# Altium footprint library 元件库PCB.PcbLib: 63 footprints (part 4 of 4)
Each footprint in its own frame and in the unit in brackets; x right, y up, seen from the top. Pads: shape width x height; smd on the part's side, far side on the other; paste and mask are expansions set on the pad; w line width, h text height; cw(c..) or ccw(c..) is an arc to the next point about the centre after c.
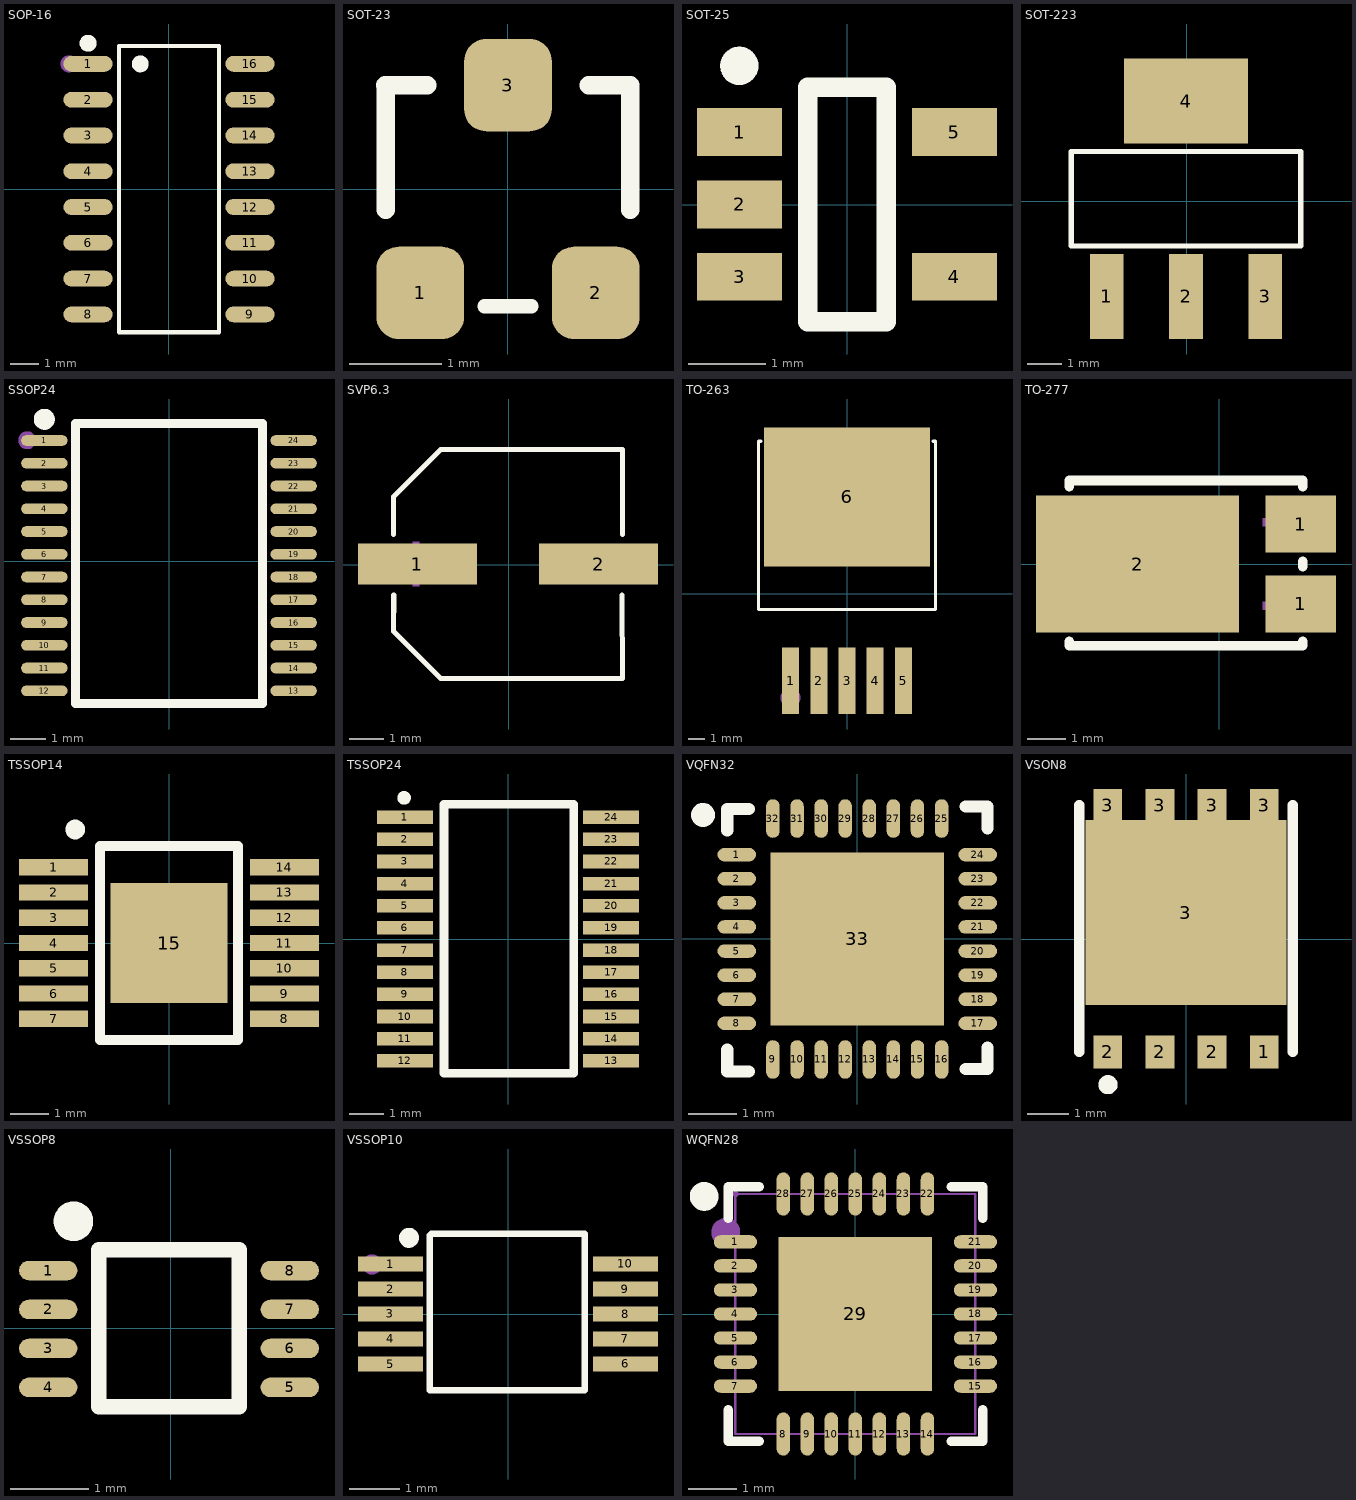
[diagram p3: the footprints below, top view; thin cyan lines are the x and y axes]

## SOP-16 [mm]
pads (16):
  oval 1.745x0.56 smd mask+0.051: 1(-2.872,4.445) 2(-2.872,3.175) 3(-2.872,1.905) 4(-2.872,0.635) 5(-2.872,-0.635) 6(-2.872,-1.905) 7(-2.872,-3.175) 8(-2.872,-4.445) 9(2.872,-4.445) 10(2.872,-3.175) 11(2.872,-1.905) 12(2.872,-0.635) 13(2.872,0.635) 14(2.872,1.905) 15(2.872,3.175) 16(2.872,4.445)
Top Overlay:
  circle w0.3: c-2.872,5.177 r0.15
  circle w0.3: c-1.019,4.445 r0.15
  lines w0.152: -1.771,-5.076 -1.771,5.076 1.771,5.076 1.771,-5.076 -1.771,-5.076
Mechanical 6:
  circle w0.3: c-3.55,4.445 r0.15
3D body "User Library-sop16-1.step": height 1.58, standoff 0, extent -3.117,-4.991 3.117,4.99

## SOT-23 [mm]
height 1.1
pads (3):
  rrect50% 0.95x1 smd: 1(-0.95,-1.125) 2(0.95,-1.125) 3(0,1.125)
Top Overlay:
  lines w0.152: -0.254,-1.27 0.254,-1.27
  lines w0.2: -1.328,1.125 -0.875,1.125 ; -1.325,-0.225 -1.325,1.125 ; 0.875,1.125 1.325,1.125 1.325,-0.225
3D body "User Library-SOT23-3.step": height 1.3, standoff 0, extent -1.448,-1.397 1.452,1.403

## SOT-25 [mil]
pads (5):
  rect 43.5x24.5 smd: 1(-55,37.01) 2(-55,0.01) 3(-55,-36.99) 4(55,-36.99) 5(55,37.01)
Top Overlay:
  lines w9.8: -60,70.91 ccw(c-55.1,70.96) -60,71.01
  lines w10: -20,-60 20,-60 20,60 -20,60 -20,-60
3D body "User Library-sot25.step": height 43.31, standoff -1.97, extent -47.24,-58.11 47.24,60

## SOT-223 [mm]
pads (4):
  rect 0.98x2.47 smd: 1(-2.327,-2.757) 2(-0.027,-2.757) 3(2.273,-2.757)
  rect 3.6x2.47 smd: 4(-0.027,2.913)
Top Overlay:
  lines w0.152: -3.353,-1.293 -3.353,1.45 3.3,1.45 3.3,-1.293 -3.353,-1.293
3D body "ALSRobot-SOT223.step": height 1.65, standoff 0, extent -3.25,-3.5 3.25,3.5

## SSOP24 [mm]
pads (24):
  oval 1.324x0.308 smd: 1(-3.562,3.448) 2(-3.562,2.798) 3(-3.562,2.148) 4(-3.562,1.498) 5(-3.562,0.848) 6(-3.562,0.198) 7(-3.562,-0.452) 8(-3.562,-1.102) 9(-3.562,-1.752) 10(-3.562,-2.402) 11(-3.562,-3.052) 12(-3.562,-3.702) 13(3.562,-3.702) 14(3.562,-3.052) 15(3.562,-2.402) 16(3.562,-1.752) 17(3.562,-1.102) 18(3.562,-0.452) 19(3.562,0.198) 20(3.562,0.848) 21(3.562,1.498) 22(3.562,2.148) 23(3.562,2.798) 24(3.562,3.448)
Top Overlay:
  circle w0.3: c-3.562,4.054 r0.15
  lines w0.254: -2.667,-4.064 -2.667,3.937 2.667,3.937 2.667,-4.064 -2.667,-4.064
Mechanical 15:
  circle w0.254: c-4.046,3.455 r0.127
3D body "User Library-SSOP 24 PIN_.step": height 1.98, standoff 0, extent -3.95,-4.442 3.95,4.188

## SVP6.3 [mm]
pads (2):
  rect 3.5x1.2 smd: 1(-2.695,0.023) 2(2.645,0.023)
Top Overlay:
  lines w0.152: -3.401,0.889 -3.401,2.003 -2.005,3.399 3.351,3.399 3.345,0.889 ; -3.39,-0.889 -3.401,-1.958 -2.006,-3.353 3.351,-3.353 3.332,-0.889
Mechanical 15:
  region: 3.077,0.122 3.077,-0.076 2.285,-0.076 2.285,0.122
  region: -3.127,0.122 -3.127,-0.076 -2.335,-0.076 -2.335,0.122
  region: -2.835,0.683 -2.835,-0.637 -2.637,-0.637 -2.637,0.683
3D body "User Library-CAP SMD SVP 6_3x5_9.STEP": height 5.9, standoff 0, extent -3.65,-3.3 3.65,3.3

## TO-263 [mm]
pads (6):
  rect 1.02x4 smd: 1(-3.427,-5.267) 2(-1.727,-5.267) 3(-0.027,-5.267) 4(1.673,-5.267) 5(3.373,-5.267)
  rect 10x8.4 smd: 6(-0.027,5.833)
Top Overlay:
  lines w0.2: -5.231,9.193 -5.361,9.193 -5.361,-0.967 5.307,-0.967 5.307,9.193 5.177,9.193 ; -3.846,-0.967 -3.817,-0.967 ; -2.146,-0.967 -2.117,-0.967 ; -0.446,-0.967 -0.417,-0.967 ; 1.254,-0.967 1.283,-0.967 ; 2.954,-0.967 2.983,-0.967
Mechanical 15:
  circle w0.6: c-3.437,-6.287 r0.3
3D body "User Library-MIC29302WU.step": height 4.4, standoff -0.15, extent -5.15,-6.09 5.15,9.138

## TO-277 [mm]
pads (3):
  rect 1.85x1.5 smd: 1(2.15,-1.05) 1(2.15,1.05)
  rect 5.35x3.6 smd: 2(-2.15,0)
Top Overlay:
  lines w0.254: -3.95,-2.031 -3.95,-2.15 2.2,-2.15 2.2,-2.031 ; -3.95,2.031 -3.95,2.2 2.2,2.2 2.2,2.031 ; 2.2,-0.069 2.2,0.069
Mechanical 15:
  region: 0.05,1 0.05,-1 -1.25,0
  region: 1.15,-1 1.95,-1 1.95,-1.2 1.15,-1.2
  region: 1.45,-1.5 1.45,-0.7 1.65,-0.7 1.65,-1.5
  region: 1.45,0.7 1.45,1.5 1.65,1.5 1.65,0.7
  region: 1.15,1.2 1.95,1.2 1.95,1 1.15,1
  region: -3.65,0.2 -2.05,0.2 -2.05,-0.2 -3.65,-0.2
3D body "User Library-TO-277A.step": height 1.2, standoff 0, extent -4.237,-2.337 2.413,2.413

## TSSOP14 [mil]
pads (15):
  rect 70.1x16.5 smd: 1(-116.9,76.8) 2(-116.9,51.2) 3(-116.9,25.6) 4(-116.9,0) 5(-116.9,-25.6) 6(-116.9,-51.2) 7(-116.9,-76.8) 8(116.9,-76.8) 9(116.9,-51.2) 10(116.9,-25.6) 11(116.9,0) 12(116.9,25.6) 13(116.9,51.2) 14(116.9,76.8)
  rect 118.1x122 smd: 15(0,0)
Top Overlay:
  circle w10: c-95,115 r5
  lines w10: -70,-98.4 70,-98.4 70,98.4 -70,98.4 -70,-98.4
3D body "User Library-TSSOP14-1.step": height 43.31, standoff 0, extent -125.98,-98.43 125.98,98.43

## TSSOP24 [mm]
pads (24):
  rect 1.65x0.4 smd: 1(-3.023,3.575) 2(-3.023,2.925) 3(-3.023,2.275) 4(-3.023,1.625) 5(-3.023,0.975) 6(-3.023,0.325) 7(-3.023,-0.325) 8(-3.023,-0.975) 9(-3.023,-1.625) 10(-3.023,-2.275) 11(-3.023,-2.925) 12(-3.023,-3.575) 13(3.023,-3.575) 14(3.023,-2.925) 15(3.023,-2.275) 16(3.023,-1.625) 17(3.023,-0.975) 18(3.023,-0.325) 19(3.023,0.325) 20(3.023,0.975) 21(3.023,1.625) 22(3.023,2.275) 23(3.023,2.925) 24(3.023,3.575)
Top Overlay:
  circle w0.2: c-3.048,4.14 r0.1
  lines w0.254: -1.88,-3.937 1.93,-3.937 1.93,3.956 -0.552,3.956 -1.88,3.956 -1.88,-3.937
3D body "User Library-AD8400 TSSOP.step": height 1.17, standoff -0.01, extent -3.203,-3.99 3.203,3.9

## VQFN32 [mm]
pads (33):
  oval 0.8x0.28 smd: 1(-2.5,1.75) 2(-2.5,1.25) 3(-2.5,0.75) 4(-2.5,0.25) 5(-2.5,-0.25) 6(-2.5,-0.75) 7(-2.5,-1.25) 8(-2.5,-1.75) 17(2.5,-1.75) 18(2.5,-1.25) 19(2.5,-0.75) 20(2.5,-0.25) 21(2.5,0.25) 22(2.5,0.75) 23(2.5,1.25) 24(2.5,1.75)
  oval 0.28x0.8 smd: 9(-1.75,-2.5) 10(-1.25,-2.5) 11(-0.75,-2.5) 12(-0.25,-2.5) 13(0.25,-2.5) 14(0.75,-2.5) 15(1.25,-2.5) 16(1.75,-2.5) 25(1.75,2.5) 26(1.25,2.5) 27(0.75,2.5) 28(0.25,2.5) 29(-0.25,2.5) 30(-0.75,2.5) 31(-1.25,2.5) 32(-1.75,2.5)
  rect 3.6x3.6 smd: 33(0,0)
Top Overlay:
  lines w0.25: -3.076,2.573 cw(c-3.201,2.574) -3.076,2.576
  lines w0.254: -2.7,-2.3 -2.7,-2.75 -2.25,-2.75 ; -2.7,2.25 -2.7,2.7 -2.25,2.7 ; 2.25,-2.7 2.7,-2.7 2.7,-2.25 ; 2.25,2.75 2.7,2.75 2.7,2.3
3D body "User Library-QFN32-1.step": height 0.9, standoff -0.03, extent -2.5,-2.5 2.5,2.5

## VSON8 [mm]
pads (9):
  rect 0.7x0.8 smd: 1(1.906,-2.747) 2(-1.904,-2.747) 2(-0.636,-2.747) 2(0.636,-2.747) 3(-1.906,3.252) 3(-0.636,3.252) 3(0.634,3.252) 3(1.904,3.252)
  rect 4.9x4.5 smd: 3(-0.001,0.642)
Top Overlay:
  circle w0.254: c-1.9,-3.548 r0.105
  lines w0.254: -2.6,-2.747 -2.6,3.252 ; 2.6,-2.747 2.6,3.252
3D body "User Library-DQH0008A.STEP": height 1.05, standoff 0, extent -2.5,-2.746 2.5,3.254

## VSSOP8 [mm]
pads (8):
  oval 0.75x0.25 smd: 1(-1.574,0.743) 2(-1.574,0.243) 3(-1.574,-0.257) 4(-1.574,-0.757) 5(1.526,-0.757) 6(1.526,-0.257) 7(1.526,0.243) 8(1.526,0.743)
Top Overlay:
  circle w0.254: c-1.25,1.375 r0.127
  lines w0.2: -0.924,0.993 -0.924,-1.007 0.876,-1.007 0.876,0.993 ; -0.924,1.009 0.23,1.009 0.876,1.009
3D body "User Library-VSSOP8-3.STEP": height 0.89, standoff -0.01, extent -1.55,-1 1.55,1

## VSSOP10 [mm]
pads (10):
  rect 1.3x0.3 smd: 1(-2.35,1) 2(-2.35,0.5) 3(-2.35,0) 4(-2.35,-0.5) 5(-2.35,-1) 6(2.35,-1) 7(2.35,-0.5) 8(2.35,0) 9(2.35,0.5) 10(2.35,1)
Top Overlay:
  circle w0.2: c-1.981,1.524 r0.1
  lines w0.127: -1.564,-1.522 1.537,-1.522 1.537,1.603 -1.538,1.603 ; -1.562,-1.522 -1.562,1.578
Mechanical 15:
  circle w0.2: c-2.718,0.99 r0.1
3D body "User Library-DGS0010A.STEP": height 1.1, standoff 0, extent -2.463,-1.5 2.463,1.5

## WQFN28 [mm]
pads (29):
  oval 0.9x0.28 smd mask+0.051: 1(-2.5,1.501) 2(-2.5,1.001) 3(-2.5,0.501) 4(-2.5,0) 5(-2.5,-0.5) 6(-2.5,-1.001) 7(-2.5,-1.501) 15(2.5,-1.501) 16(2.5,-1.001) 17(2.5,-0.5) 18(2.5,0) 19(2.5,0.501) 20(2.5,1.001) 21(2.5,1.501)
  oval 0.28x0.9 smd mask+0.051: 8(-1.501,-2.5) 9(-1.001,-2.5) 10(-0.501,-2.5) 11(0,-2.5) 12(0.5,-2.5) 13(1.001,-2.5) 14(1.501,-2.5) 22(1.501,2.5) 23(1.001,2.5) 24(0.5,2.5) 25(0,2.5) 26(-0.501,2.5) 27(-1.001,2.5) 28(-1.501,2.5)
  rect 3.2x3.2 smd mask+0.051: 29(0,0)
Top Overlay:
  lines w0.2: -2.65,-2 -2.65,-2.65 -2,-2.65 ; -2.65,2 -2.65,2.65 -2,2.65 ; 2,-2.65 2.65,-2.65 2.65,-2 ; 2,2.65 2.65,2.65 2.65,2
  lines w0.3: -3,2.449 cw(c-3.15,2.45) -3,2.451
Mechanical 6:
  circle w0.3: c-2.7,1.7 r0.15
Mechanical 15:
  drawing of 34 lines, arcs and shapes, not listed
3D body "321.stp": height 0.9, standoff 0, extent -2.46,-2.46 2.54,2.54